# Altium footprint library DaughterBoard.PcbLib: 103 footprints (part 7 of 7)
Each footprint in its own frame and in the unit in brackets; x right, y up, seen from the top. Pads: shape width x height; smd on the part's side, far side on the other; paste and mask are expansions set on the pad; w line width, h text height; cw(c..) or ccw(c..) is an arc to the next point about the centre after c.
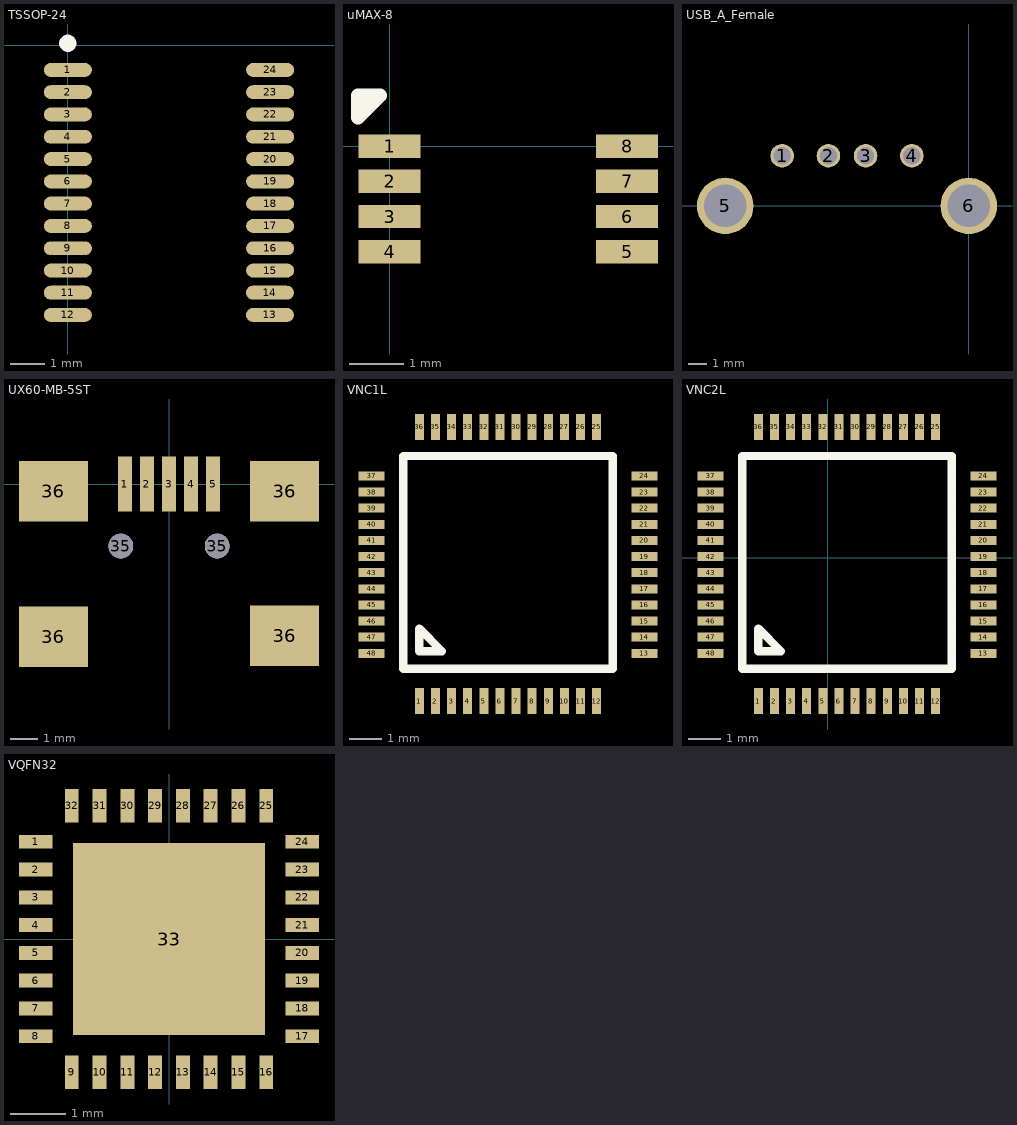
[diagram p6: the footprints below, top view; thin cyan lines are the x and y axes]

## TSSOP-24 [mm]
pads (24):
  oval 1.4x0.406 smd: 1(-0.004,-0.722) 2(-0.004,-1.372) 3(-0.004,-2.022) 4(-0.004,-2.672) 5(-0.004,-3.322) 6(-0.004,-3.972) 7(-0.004,-4.622) 8(-0.004,-5.272) 9(-0.004,-5.922) 10(-0.004,-6.572) 11(-0.004,-7.218) 12(-0.004,-7.868) 13(5.889,-7.868) 14(5.889,-7.218) 15(5.896,-6.572) 16(5.896,-5.922) 17(5.896,-5.272) 18(5.896,-4.622) 19(5.896,-3.972) 20(5.896,-3.322) 21(5.896,-2.672) 22(5.896,-2.022) 23(5.896,-1.372) 24(5.896,-0.722)
Top Overlay:
  circle w0.25: c-0.004,0.053 r0.125
3D body "User Library-TSSOP24_(JEDEC_MO-153).step": height 1.2, standoff 0, extent -0.331,-8.242 6.224,-0.342

## uMAX-8 [mil]
pads (8):
  rect 45x17 smd: 1(0,0) 2(0,-25.59) 3(0,-51.18) 4(0,-76.77) 5(173,-76.77) 6(173,-51.18) 7(173,-25.59) 8(173,0)
Top Overlay:
  lines w10: -23,21 -7,37 -23,37 -23,21
3D body "User Library-uMAX8.STEP": height 37.4, standoff 0, extent -10.38,-98.1 186.5,20

## USB_A_Female [mm]
pads (6):
  round 1.27 hole 0.94: 1(-10.07,2.7) 2(-7.57,2.7) 3(-5.57,2.7) 4(-3.07,2.71)
  round 3.048 hole 2.3: 5(-13.14,0) 6(0,0)
3D body "14388.stp": height 7, standoff -3.85, extent -14.529,-10.487 1.271,4.013

## UX60-MB-5ST [mm]
pads (11):
  rect 0.5x2 smd: 1(-1.6,0) 2(-0.8,0) 3(0,0) 4(0.8,0) 5(1.6,0)
  round 0.9 hole 0.9: 35(-1.75,-2.25) 35(1.75,-2.25)
  rect 2.5x2.2 smd: 36(-4.2,-5.55) 36(-4.2,-0.25) 36(4.2,-5.5) 36(4.2,-0.25)
3D body "User Library-UX60-MB-5ST.STEP": height 4.6, standoff -0.5, extent -4.95,-8.635 4.95,0.365

## VNC1L [mm]
pads (48):
  rect 0.28x0.8 smd: 1(-71.65,-13.35) 2(-71.15,-13.35) 3(-70.65,-13.35) 4(-70.15,-13.35) 5(-69.65,-13.35) 6(-69.15,-13.35) 7(-68.65,-13.35) 8(-68.15,-13.35) 9(-67.65,-13.35) 10(-67.15,-13.35) 11(-66.65,-13.35) 12(-66.15,-13.35) 25(-66.15,-4.85) 26(-66.65,-4.85) 27(-67.15,-4.85) 28(-67.65,-4.85) 29(-68.15,-4.85) 30(-68.65,-4.85) 31(-69.15,-4.85) 32(-69.65,-4.85) 33(-70.15,-4.85) 34(-70.65,-4.85) 35(-71.15,-4.85) 36(-71.65,-4.85)
  rect 0.8x0.28 smd: 13(-64.67,-11.87) 14(-64.67,-11.37) 15(-64.67,-10.87) 16(-64.67,-10.37) 17(-64.67,-9.87) 18(-64.67,-9.37) 19(-64.67,-8.87) 20(-64.67,-8.37) 21(-64.67,-7.87) 22(-64.67,-7.37) 23(-64.67,-6.87) 24(-64.67,-6.37) 37(-73.13,-6.37) 38(-73.13,-6.87) 39(-73.13,-7.37) 40(-73.13,-7.87) 41(-73.13,-8.37) 42(-73.13,-8.87) 43(-73.13,-9.37) 44(-73.13,-9.87) 45(-73.13,-10.37) 46(-73.13,-10.87) 47(-73.13,-11.37) 48(-73.13,-11.87)
Top Overlay:
  lines w0.254: -72.15,-12.35 -72.15,-5.75 -65.65,-5.75 -65.65,-12.35 -72.15,-12.35 ; -71.65,-11.805 -71.65,-11.105 -70.95,-11.805 -71.65,-11.805
3D body: height 0.25, standoff 0, extent -67.6,-6.75 -67.6,-6.75
3D body "User Library-LQFP50P700X700x160-48N.STEP": height 1.6, standoff 0.01, extent -73.39,-13.59 -64.41,-4.61

## VNC2L [mm]
pads (48):
  rect 0.28x0.8 smd: 1(-2.15,-4.45) 2(-1.65,-4.45) 3(-1.15,-4.45) 4(-0.65,-4.45) 5(-0.15,-4.45) 6(0.35,-4.45) 7(0.85,-4.45) 8(1.35,-4.45) 9(1.85,-4.45) 10(2.35,-4.45) 11(2.85,-4.45) 12(3.35,-4.45) 25(3.35,4.05) 26(2.85,4.05) 27(2.35,4.05) 28(1.85,4.05) 29(1.35,4.05) 30(0.85,4.05) 31(0.35,4.05) 32(-0.15,4.05) 33(-0.65,4.05) 34(-1.15,4.05) 35(-1.65,4.05) 36(-2.15,4.05)
  rect 0.8x0.28 smd: 13(4.83,-2.97) 14(4.83,-2.47) 15(4.83,-1.97) 16(4.83,-1.47) 17(4.83,-0.97) 18(4.83,-0.47) 19(4.83,0.03) 20(4.83,0.53) 21(4.83,1.03) 22(4.83,1.53) 23(4.83,2.03) 24(4.83,2.53) 37(-3.63,2.53) 38(-3.63,2.03) 39(-3.63,1.53) 40(-3.63,1.03) 41(-3.63,0.53) 42(-3.63,0.03) 43(-3.63,-0.47) 44(-3.63,-0.97) 45(-3.63,-1.47) 46(-3.63,-1.97) 47(-3.63,-2.47) 48(-3.63,-2.97)
Top Overlay:
  lines w0.254: -2.65,-3.45 3.85,-3.45 3.85,3.15 -2.65,3.15 -2.65,-3.45 ; -2.15,-2.905 -1.45,-2.905 -2.15,-2.205 -2.15,-2.905
3D body: height 0.25, standoff 0, extent 1.9,2.15 1.9,2.15
3D body "User Library-LQFP50P700X700x160-48N.STEP": height 1.6, standoff 0.01, extent -3.89,-4.69 5.09,4.29

## VQFN32 [mm]
pads (33):
  rect 0.6x0.25 smd: 1(-2.4,1.75) 2(-2.4,1.25) 3(-2.4,0.75) 4(-2.4,0.25) 5(-2.4,-0.25) 6(-2.4,-0.75) 7(-2.4,-1.25) 8(-2.4,-1.75) 17(2.4,-1.75) 18(2.4,-1.25) 19(2.4,-0.75) 20(2.4,-0.25) 21(2.4,0.25) 22(2.4,0.75) 23(2.4,1.25) 24(2.4,1.75)
  rect 0.25x0.6 smd: 9(-1.75,-2.4) 10(-1.25,-2.4) 11(-0.75,-2.4) 12(-0.25,-2.4) 13(0.25,-2.4) 14(0.75,-2.4) 15(1.25,-2.4) 16(1.75,-2.4) 25(1.75,2.4) 26(1.25,2.4) 27(0.75,2.4) 28(0.25,2.4) 29(-0.25,2.4) 30(-0.75,2.4) 31(-1.25,2.4) 32(-1.75,2.4)
  rect 3.45x3.45 smd: 33(0,0)
3D body "User Library-VQFN-32.step": height 1.01, standoff 0, extent -2.55,-2.56 2.57,2.56